# Altium footprint library Misc.PcbLib: 159 footprints (part 9 of 10)
Each footprint in its own frame and in the unit in brackets; x right, y up, seen from the top. Pads: shape width x height; smd on the part's side, far side on the other; paste and mask are expansions set on the pad; w line width, h text height; cw(c..) or ccw(c..) is an arc to the next point about the centre after c.
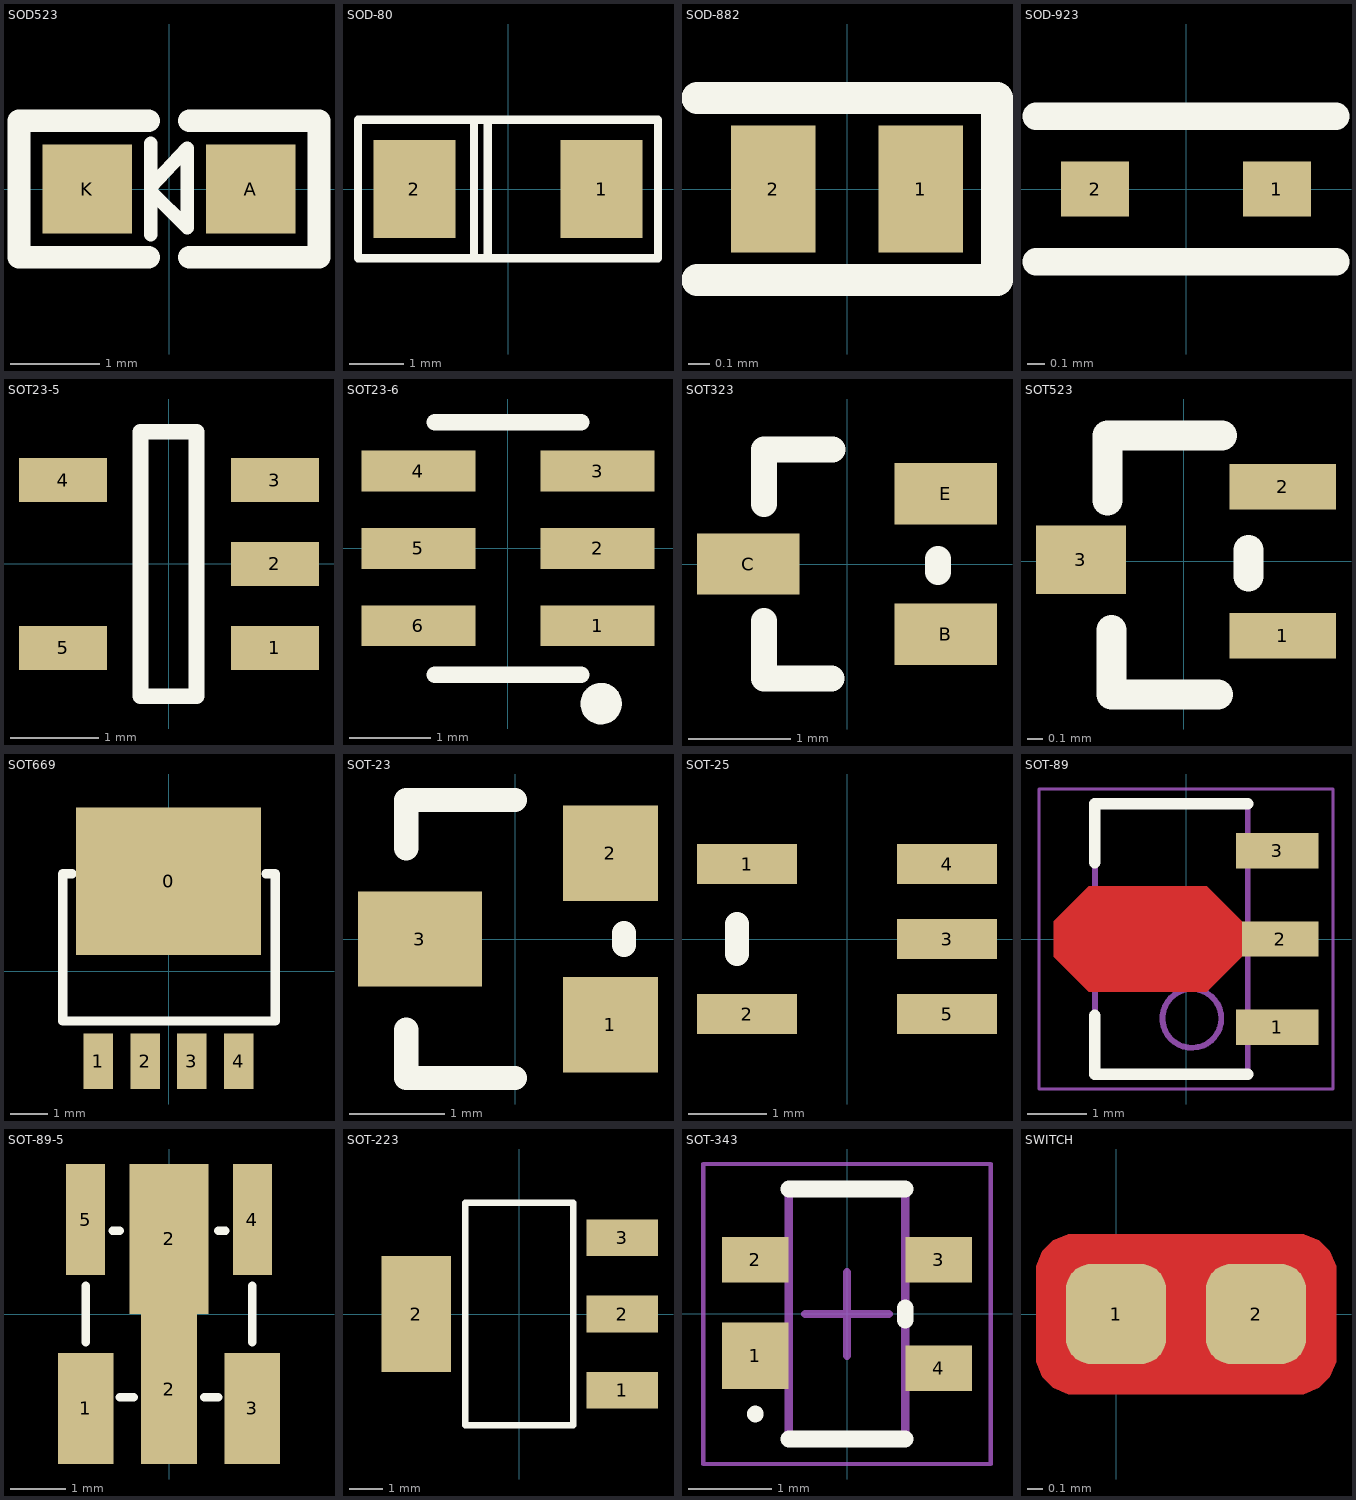
[diagram p8: the footprints below, top view; thin cyan lines are the x and y axes]

## SOD523 [mm] "0603"
pads (2):
  rect 1x1 smd: A(0.914,0) K(-0.914,0)
Top Overlay:
  lines w0.152: -0.203,-0.508 -0.203,0.508 ; -0.203,-0.025 0.203,-0.432 0.203,0.457 -0.203,0.025
  lines w0.254: -0.229,-0.762 -1.676,-0.762 -1.676,0.762 -0.229,0.762 ; 0.229,-0.762 1.676,-0.762 1.676,0.762 0.229,0.762
3D body "SOD-523.STEP": height 0.65, standoff 0, extent -0.813,-0.419 0.787,0.381

## SOD-80 [mm] "LL34 SOD-80"
pads (2):
  rect 1.5x1.8 smd: 1(1.714,0) 2(-1.714,0)
Top Overlay:
  lines w0.152: -0.623,-1.27 -0.623,1.27 ; -0.373,-1.27 -0.373,1.27 ; -2.75,-1.27 -2.75,1.27 2.75,1.27 2.75,-1.27 -2.75,-1.27
3D body "SOD-80.STEP": height 1.5, standoff 0, extent -1.814,-0.75 1.686,0.75

## SOD-882 [mm]
height 0.5
pads (2):
  rect 0.4x0.6 smd: 1(0.35,0) 2(-0.35,0)
Top Overlay:
  lines w0.152: -0.711,-0.432 0.711,-0.432 0.711,0.432 -0.711,0.432
3D body "SOD-882.STEP": height 0.5, standoff 0, extent -0.52,-0.32 0.52,0.32

## SOD-923 [mil]
pads (2):
  rect 15x12 smd: 1(20,0) 2(-20,0)
Top Overlay:
  lines w6: -33,-16 33,-16 ; -33,16 33,16
3D body "SOD-923.STEP": height 15.75, standoff 0, extent -20.47,-12.8 20.87,12.7

## SOT23-5 [mm]
pads (5):
  rect 1x0.5 smd: 1(1.2,-0.95) 2(1.2,0) 3(1.2,0.95) 4(-1.2,0.95) 5(-1.2,-0.95)
Top Overlay:
  lines w0.178: -0.324,-1.5 -0.324,1.5 0.311,1.5 0.311,-1.5 -0.324,-1.5
3D body "User Library-SOT23-5.STEP": height 1.09, standoff -0.01, extent -1.399,-1.45 1.401,1.449

## SOT23-6 [mm] "SOT-23/SC-74A; 5 Leads; Body 3.1 x 3 mm, inc. leads (LxW max)"
height 1.45
pads (6):
  rect 1.4x0.5 smd: 1(1.1,-0.95) 2(1.1,0) 3(1.1,0.95) 4(-1.1,0.95) 5(-1.1,0) 6(-1.1,-0.95)
Top Overlay:
  circle w0.254: c1.143,-1.905 r0.127
  lines w0.2: -0.9,-1.55 0.9,-1.55 ; -0.9,1.55 0.9,1.55
3D body "User Library-SOT-23-6.STEP": height 1.08, standoff -0.01, extent -1.194,-1.397 1.232,1.397

## SOT323 [mm]
pads (3):
  rect 1x0.6 smd: B(0.965,-0.686) C(-0.965,0) E(0.965,0.686)
Top Overlay:
  lines w0.254: -0.813,-0.559 -0.813,-1.118 -0.152,-1.118 ; -0.813,0.584 -0.813,1.118 -0.143,1.118 ; 0.889,-0.076 0.889,0.051
3D body "SOT323 (SC70-3)-1.STEP": height 1.1, standoff 0, extent -1.148,-1.092 1.097,1.108

## SOT523 [mil]
pads (3):
  rect 28x12 smd: 1(25.98,-19.58) 2(25.98,19.58)
  rect 23.62x18 smd: 3(-26.98,0.46)
Top Overlay:
  lines w7.87: -20,16 -20,33 10,33 ; -19,-18 -19,-35 9,-35 ; 17,-4 17,3
3D body "SOT-523.step": height 31.5, standoff 0, extent -30.49,-31.5 32.5,31.49

## SOT669 [mm] "IFPAK"
pads (5):
  rect 5x4 smd: 0(0,2.438)
  rect 0.8x1.5 smd: 1(-1.905,-2.438) 2(-0.635,-2.438) 3(0.635,-2.438) 4(1.905,-2.438)
Top Overlay:
  lines w0.254: -2.616,2.642 -2.87,2.642 -2.87,-1.346 2.896,-1.346 2.896,2.642 2.642,2.642
3D body "User Library-SOT669-CW.step": height 1.55, standoff 0.35, extent -2.45,-2.593 2.45,3.835

## SOT-23 [mm]
pads (3):
  rect 1x1 smd: 1(1,-0.9) 2(1,0.9)
  rect 1.3x1 smd: 3(-1,0)
Top Overlay:
  lines w0.254: -1.143,-0.953 -1.143,-1.46 0,-1.46 ; -1.143,0.953 -1.143,1.46 0,1.46 ; 1.143,-0.064 1.143,0.064
3D body "SOT-23-3.STEP": height 1.2, standoff 0, extent -1.4,-1.45 1.4,1.45

## SOT-25 [mil]
pads (5):
  rect 50x20 smd: 1(-50,37.5) 2(-50,-37.5) 3(50,0) 4(50,37.5) 5(50,-37.5)
Top Overlay:
  lines w12: -55,-7.5 -55,7.5

## SOT-89 [mm] "SOT89, 3-Leads, Body 4.50x2.50mm, Pitch 1.50mm, Lead Span 3.5mm, IPC Medium Density"
height 1.6
pads (3):
  rect 1.4x0.6 smd: 1(1.55,-1.5) 3(1.55,1.5)
  rect 1.3x0.6 smd: 2(1.6,0)
Top Layer:
  region: 0.95,-0.3 0.35,-0.9 -1.65,-0.9 -2.25,-0.3 -2.25,0.3 -1.65,0.9 0.35,0.9 0.95,0.3
Top Overlay:
  lines w0.2: -1.55,-1.3 -1.55,-2.3 1.05,-2.3 ; -1.55,1.3 -1.55,2.3 1.05,2.3
Mechanical 13:
  circle w0.1: c0.1,-1.35 r0.5
  lines w0.1: -1.55,-2.3 1.05,-2.3 1.05,2.3 -1.55,2.3 -1.55,-2.3
Mechanical 15:
  lines w0.05: -2.5,-2.55 2.5,-2.55 2.5,2.55 -2.5,2.55 -2.5,-2.55
  lines w0.1: -0.75,0 0.25,0 ; -0.25,-0.5 -0.25,0.5
3D body "SOT89.step": height 1.6, standoff 0, extent -1.85,-2.3 2.2,2.3

## SOT-89-5 [mm]
pads (6):
  rect 1x2 smd: 1(-1.5,-1.7) 3(1.5,-1.7)
  rect 1x2.7 smd: 2(0,-1.35)
  rect 1.422x2.7 smd: 2(0,1.35)
  rect 0.7x2 smd: 4(1.5,1.7) 5(-1.5,1.7)
Top Overlay:
  lines w0.15: -1.5,-0.508 -1.5,0.508 ; -1.016,1.5 -0.889,1.5 ; -0.889,-1.5 -0.635,-1.5 ; 0.635,-1.5 0.889,-1.5 ; 0.889,1.5 1.016,1.5 ; 1.5,-0.508 1.5,0.508
3D body "SW3dPS-SOT895-A-PKG.STEP": height 1.2, standoff -0.3, extent -2.25,-1.9 2.25,1.9

## SOT-223 [mm] "SOT-223/SC-73; 4 Leads; Body 6.7 x 7.3 mm, inc. leads (LxW max)"
height 1.78
pads (4):
  rect 2.15x1.1 smd: 1(3.1,-2.3) 2(3.1,0) 3(3.1,2.3)
  rect 2.1x3.5 smd: 2(-3.1,0)
Top Overlay:
  lines w0.2: -1.625,-3.35 -1.625,3.35 1.625,3.35 1.625,-3.35 -1.625,-3.35
3D body "SOT-223_MP04A.STEP": height 1.7, standoff 0, extent -3.48,-3.25 3.48,3.25

## SOT-343 [mm] "SOT143, 4-Leads, Body 2.92x2.10mm, Pitch 1.30mm, IPC Medium Density"
height 1.2
pads (4):
  rect 0.8x0.8 smd: 1(-1.1,-0.5)
  rect 0.8x0.55 smd: 2(-1.1,0.65) 3(1.1,0.65) 4(1.1,-0.65)
Top Overlay:
  circle w0.1: c-1.1,-1.2 r0.05
  lines w0.2: -0.7,-1.5 0.7,-1.5 ; -0.7,1.5 0.7,1.5 ; 0.7,-0.075 0.7,0.075
Mechanical 13:
  lines w0.1: -0.7,-1.52 0.7,-1.52 0.7,1.52 -0.7,1.52 -0.7,-1.52
Mechanical 15:
  lines w0.05: -1.725,-1.8 1.725,-1.8 1.725,1.8 -1.725,1.8 -1.725,-1.8
  lines w0.1: -0.5,0 0.5,0 ; 0,-0.5 0,0.5
3D body "SOT130P210X120-4N.step": height 1.2, standoff 0.03, extent -1.025,-1.52 1.024,1.52

## SWITCH [mil]
pads (2):
  rrect50% 25x25 smd: 1(0,0) 2(35,0)
Top Layer:
  pour cut-out: -20,10 -20,11.99 -18.48,15.66 -15.66,18.48 -11.99,20 -10,20 45,20 46.99,20 50.66,18.48 53.48,15.66 55,11.99 55,10 55,-10 55,-11.99 53.48,-15.66 50.66,-18.48 46.99,-20 45,-20 -10,-20 -11.99,-20 -15.66,-18.48 -18.48,-15.66 -20,-11.99 -20,-10
Top Solder:
  rectangle: 0,-15 35,15
  lines w3: 0,-15 35,-15 ; 0,15 35,15